# Altium footprint library ICs And Semiconductors SMD.PcbLib: 602 footprints (part 18 of 38)
Each footprint in its own frame and in the unit in brackets; x right, y up, seen from the top. Pads: shape width x height; smd on the part's side, far side on the other; paste and mask are expansions set on the pad; w line width, h text height; cw(c..) or ccw(c..) is an arc to the next point about the centre after c.
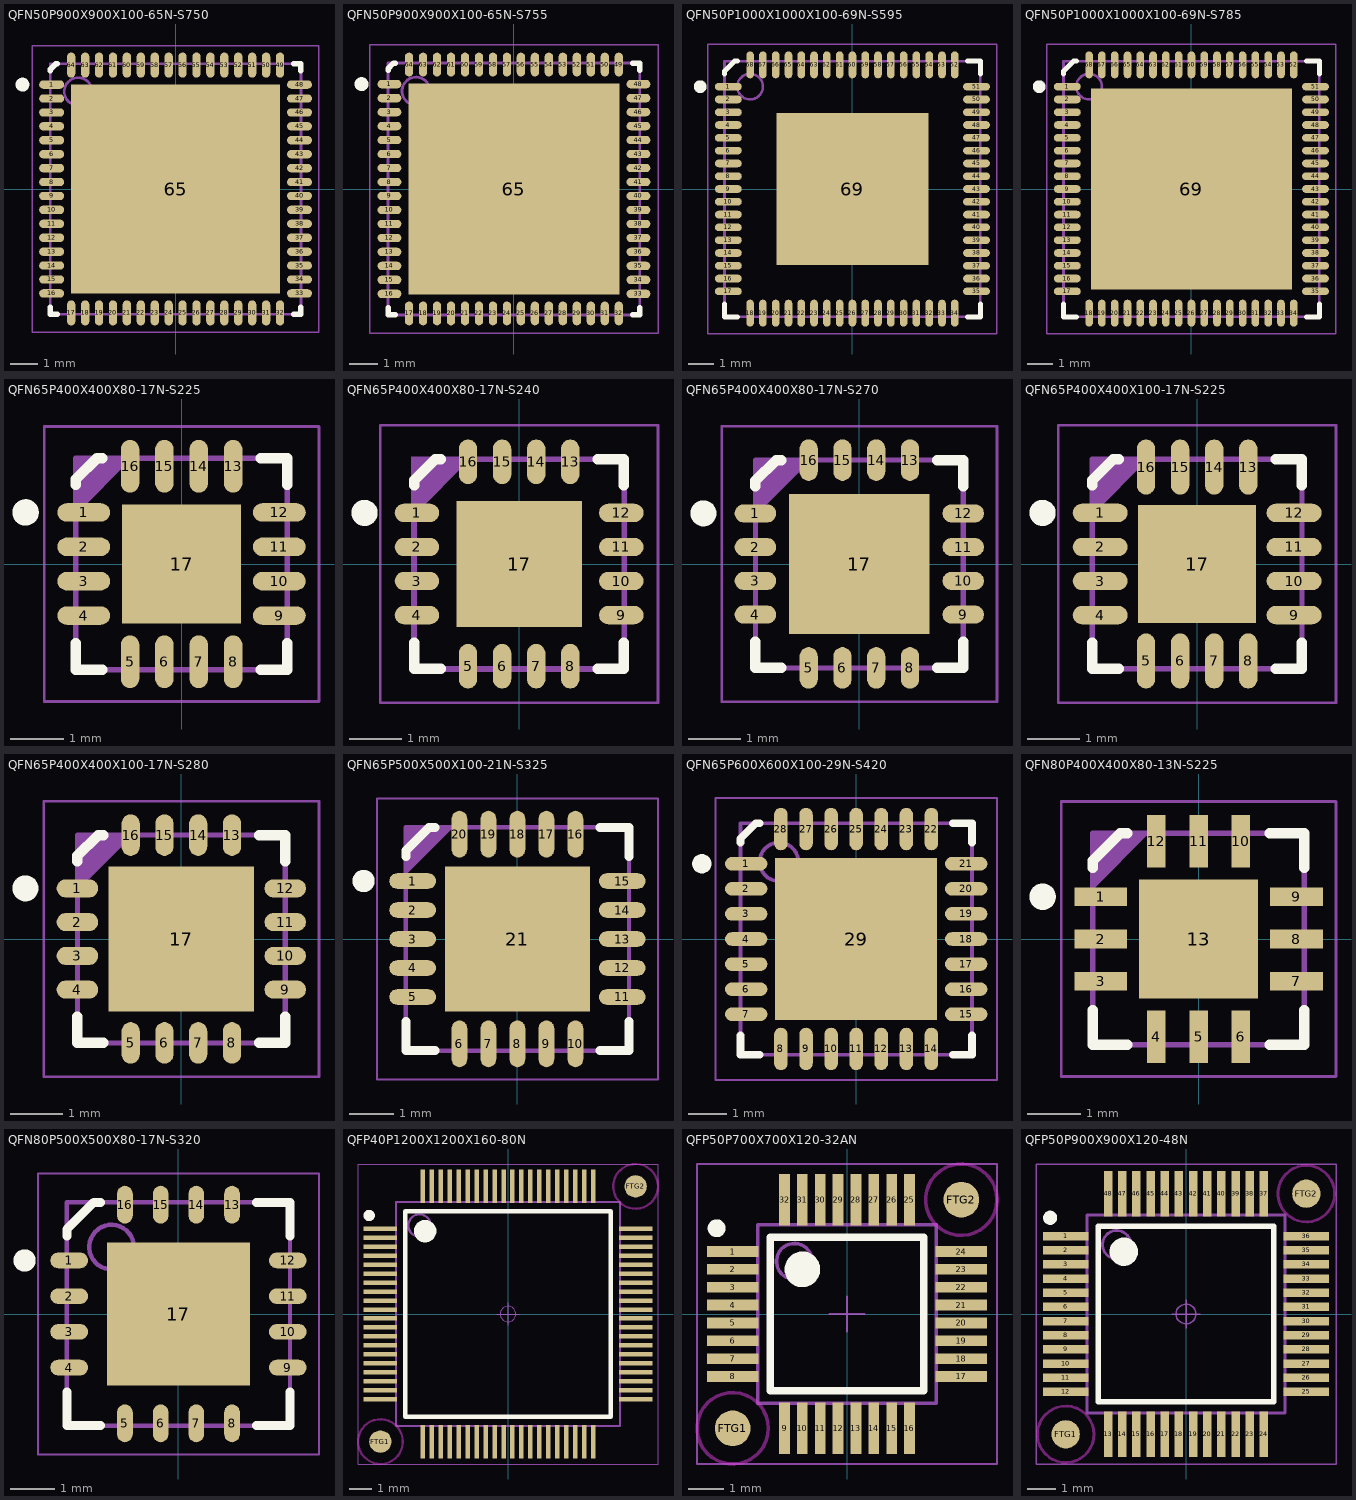
[diagram p17: the footprints below, top view; thin cyan lines are the x and y axes]

## QFN50P900X900X100-65N-S750 [mm] "QFN, 0.50mm Pitch, Square; 64 Pin, 9.00mm L X 9.00mm W X 1.00mm H Body (7.5 X 7.5mm Thermal Tab), IPC Medium Density"
height 1
pads (65):
  oval 0.9x0.3 smd: 1(-4.45,3.75) 2(-4.45,3.25) 3(-4.45,2.75) 4(-4.45,2.25) 5(-4.45,1.75) 6(-4.45,1.25) 7(-4.45,0.75) 8(-4.45,0.25) 9(-4.45,-0.25) 10(-4.45,-0.75) 11(-4.45,-1.25) 12(-4.45,-1.75) 13(-4.45,-2.25) 14(-4.45,-2.75) 15(-4.45,-3.25) 16(-4.45,-3.75) 33(4.45,-3.75) 34(4.45,-3.25) 35(4.45,-2.75) 36(4.45,-2.25) 37(4.45,-1.75) 38(4.45,-1.25) 39(4.45,-0.75) 40(4.45,-0.25) 41(4.45,0.25) 42(4.45,0.75) 43(4.45,1.25) 44(4.45,1.75) 45(4.45,2.25) 46(4.45,2.75) 47(4.45,3.25) 48(4.45,3.75)
  oval 0.3x0.9 smd: 17(-3.75,-4.45) 18(-3.25,-4.45) 19(-2.75,-4.45) 20(-2.25,-4.45) 21(-1.75,-4.45) 22(-1.25,-4.45) 23(-0.75,-4.45) 24(-0.25,-4.45) 25(0.25,-4.45) 26(0.75,-4.45) 27(1.25,-4.45) 28(1.75,-4.45) 29(2.25,-4.45) 30(2.75,-4.45) 31(3.25,-4.45) 32(3.75,-4.45) 49(3.75,4.45) 50(3.25,4.45) 51(2.75,4.45) 52(2.25,4.45) 53(1.75,4.45) 54(1.25,4.45) 55(0.75,4.45) 56(0.25,4.45) 57(-0.25,4.45) 58(-0.75,4.45) 59(-1.25,4.45) 60(-1.75,4.45) 61(-2.25,4.45) 62(-2.75,4.45) 63(-3.25,4.45) 64(-3.75,4.45)
  rect 7.5x7.5 smd: 65(0,0)
Top Overlay:
  circle w0.25: c-5.5,3.75 r0.125
  lines w0.2: -4.5,-4.25 -4.5,-4.5 -4.25,-4.5 ; -4.5,4.25 -4.5,4.3 -4.3,4.5 -4.25,4.5 ; 4.25,-4.5 4.5,-4.5 4.5,-4.25 ; 4.25,4.5 4.5,4.5 4.5,4.25
Top Paste:
  region: 1.47,1.47 1.47,3.05 3.05,3.05 3.05,1.47
  region: -0.79,1.47 -0.79,3.05 0.79,3.05 0.79,1.47
  region: -3.05,1.47 -3.05,3.05 -1.47,3.05 -1.47,1.47
  region: 1.47,-0.79 1.47,0.79 3.05,0.79 3.05,-0.79
  region: -0.79,-0.79 -0.79,0.79 0.79,0.79 0.79,-0.79
  region: -3.05,-0.79 -3.05,0.79 -1.47,0.79 -1.47,-0.79
  region: 1.47,-3.05 1.47,-1.47 3.05,-1.47 3.05,-3.05
  region: -0.79,-3.05 -0.79,-1.47 0.79,-1.47 0.79,-3.05
  region: -3.05,-3.05 -3.05,-1.47 -1.47,-1.47 -1.47,-3.05
Mechanical 14:
  circle w0.1: c-3.5,3.5 r0.5
  lines w0.1: -4.5,-4.5 4.5,-4.5 4.5,4.5 -4.5,4.5 -4.5,-4.5
Mechanical 15:
  circle w0.05: c0,0 r0.35
  lines w0.05: -0.5,0 0.5,0 ; 0,-0.5 0,0.5 ; -5.15,-5.15 5.15,-5.15 5.15,5.15 -5.15,5.15 -5.15,-5.15
3D body "QFN50P900X900X100-65N-S750.stp": height 1, standoff 0, extent -4.5,-4.5 4.5,4.5

## QFN50P900X900X100-65N-S755 [mm] "QFN, 0.50mm Pitch, Square; 64 Pin, 9.00mm L X 9.00mm W X 1.00mm H Body (7.55 X 7.55mm Thermal Tab), IPC Medium Density"
height 1
pads (65):
  oval 0.85x0.3 smd: 1(-4.45,3.75) 2(-4.45,3.25) 3(-4.45,2.75) 4(-4.45,2.25) 5(-4.45,1.75) 6(-4.45,1.25) 7(-4.45,0.75) 8(-4.45,0.25) 9(-4.45,-0.25) 10(-4.45,-0.75) 11(-4.45,-1.25) 12(-4.45,-1.75) 13(-4.45,-2.25) 14(-4.45,-2.75) 15(-4.45,-3.25) 16(-4.45,-3.75) 33(4.45,-3.75) 34(4.45,-3.25) 35(4.45,-2.75) 36(4.45,-2.25) 37(4.45,-1.75) 38(4.45,-1.25) 39(4.45,-0.75) 40(4.45,-0.25) 41(4.45,0.25) 42(4.45,0.75) 43(4.45,1.25) 44(4.45,1.75) 45(4.45,2.25) 46(4.45,2.75) 47(4.45,3.25) 48(4.45,3.75)
  oval 0.3x0.85 smd: 17(-3.75,-4.45) 18(-3.25,-4.45) 19(-2.75,-4.45) 20(-2.25,-4.45) 21(-1.75,-4.45) 22(-1.25,-4.45) 23(-0.75,-4.45) 24(-0.25,-4.45) 25(0.25,-4.45) 26(0.75,-4.45) 27(1.25,-4.45) 28(1.75,-4.45) 29(2.25,-4.45) 30(2.75,-4.45) 31(3.25,-4.45) 32(3.75,-4.45) 49(3.75,4.45) 50(3.25,4.45) 51(2.75,4.45) 52(2.25,4.45) 53(1.75,4.45) 54(1.25,4.45) 55(0.75,4.45) 56(0.25,4.45) 57(-0.25,4.45) 58(-0.75,4.45) 59(-1.25,4.45) 60(-1.75,4.45) 61(-2.25,4.45) 62(-2.75,4.45) 63(-3.25,4.45) 64(-3.75,4.45)
  rect 7.55x7.55 smd: 65(0,0)
Top Overlay:
  circle w0.25: c-5.45,3.75 r0.125
  lines w0.2: -4.5,-4.25 -4.5,-4.5 -4.25,-4.5 ; -4.5,4.25 -4.5,4.3 -4.3,4.5 -4.25,4.5 ; 4.25,-4.5 4.5,-4.5 4.5,-4.25 ; 4.25,4.5 4.5,4.5 4.5,4.25
Top Paste:
  region: 1.5,1.5 1.5,3.1 3.1,3.1 3.1,1.5
  region: -0.8,1.5 -0.8,3.1 0.8,3.1 0.8,1.5
  region: -3.1,1.5 -3.1,3.1 -1.5,3.1 -1.5,1.5
  region: 1.5,-0.8 1.5,0.8 3.1,0.8 3.1,-0.8
  region: -0.8,-0.8 -0.8,0.8 0.8,0.8 0.8,-0.8
  region: -3.1,-0.8 -3.1,0.8 -1.5,0.8 -1.5,-0.8
  region: 1.5,-3.1 1.5,-1.5 3.1,-1.5 3.1,-3.1
  region: -0.8,-3.1 -0.8,-1.5 0.8,-1.5 0.8,-3.1
  region: -3.1,-3.1 -3.1,-1.5 -1.5,-1.5 -1.5,-3.1
Mechanical 14:
  circle w0.1: c-3.5,3.5 r0.5
  lines w0.1: -4.5,-4.5 4.5,-4.5 4.5,4.5 -4.5,4.5 -4.5,-4.5
Mechanical 15:
  circle w0.05: c0,0 r0.35
  lines w0.05: -0.5,0 0.5,0 ; 0,-0.5 0,0.5 ; -5.15,-5.15 5.15,-5.15 5.15,5.15 -5.15,5.15 -5.15,-5.15
3D body "QFN50P900X900X100-65N-S755.stp": height 1, standoff 0, extent -4.5,-4.5 4.5,4.5

## QFN50P1000X1000X100-69N-S595 [mm] "QFP, 0.50mm Pitch, Square; 17 pin X 17 Pin, 10.00mm X 10.00mm (W/Thermal Tab 5.95mm X 5.95mm), IPC Medium Density"
height 1
pads (69):
  oval 1.05x0.3 smd: 1(-4.85,4) 2(-4.85,3.5) 3(-4.85,3) 4(-4.85,2.5) 5(-4.85,2) 6(-4.85,1.5) 7(-4.85,1) 8(-4.85,0.5) 9(-4.85,0) 10(-4.85,-0.5) 11(-4.85,-1) 12(-4.85,-1.5) 13(-4.85,-2) 14(-4.85,-2.5) 15(-4.85,-3) 16(-4.85,-3.5) 17(-4.85,-4) 35(4.85,-4) 36(4.85,-3.5) 37(4.85,-3) 38(4.85,-2.5) 39(4.85,-2) 40(4.85,-1.5) 41(4.85,-1) 42(4.85,-0.5) 43(4.85,0) 44(4.85,0.5) 45(4.85,1) 46(4.85,1.5) 47(4.85,2) 48(4.85,2.5) 49(4.85,3) 50(4.85,3.5) 51(4.85,4)
  oval 0.3x1.05 smd: 18(-4,-4.85) 19(-3.5,-4.85) 20(-3,-4.85) 21(-2.5,-4.85) 22(-2,-4.85) 23(-1.5,-4.85) 24(-1,-4.85) 25(-0.5,-4.85) 26(0,-4.85) 27(0.5,-4.85) 28(1,-4.85) 29(1.5,-4.85) 30(2,-4.85) 31(2.5,-4.85) 32(3,-4.85) 33(3.5,-4.85) 34(4,-4.85) 52(4,4.85) 53(3.5,4.85) 54(3,4.85) 55(2.5,4.85) 56(2,4.85) 57(1.5,4.85) 58(1,4.85) 59(0.5,4.85) 60(0,4.85) 61(-0.5,4.85) 62(-1,4.85) 63(-1.5,4.85) 64(-2,4.85) 65(-2.5,4.85) 66(-3,4.85) 67(-3.5,4.85) 68(-4,4.85)
  rect 5.95x5.95 smd: 69(0,0)
Top Overlay:
  circle w0.25: c-5.95,4 r0.125
  lines w0.2: -5,-4.5 -5,-5 -4.5,-5 ; -5,4.5 -5,4.6 -4.6,5 -4.5,5 ; 4.5,-5 5,-5 5,-4.5 ; 4.5,5 5,5 5,4.5
Top Paste:
  region: -2.24,-2.24 -2.24,-0.36 -0.36,-0.36 -0.36,-2.24
  region: 0.36,-2.24 0.36,-0.36 2.24,-0.36 2.24,-2.24
  region: -2.24,0.36 -2.24,2.24 -0.36,2.24 -0.36,0.36
  region: 0.36,0.36 0.36,2.24 2.24,2.24 2.24,0.36
Mechanical 14:
  circle w0.1: c-4,4 r0.5
  lines w0.1: -5,-5 5,-5 5,5 -5,5 -5,-5
Mechanical 15:
  lines w0.05: -5.65,-5.65 5.65,-5.65 5.65,5.65 -5.65,5.65 -5.65,-5.65
Mechanical 20:
  circle w0.05: c0,0 r0.35
  lines w0.05: -0.5,0 0.5,0 ; 0,-0.5 0,0.5
3D body "QFN50P1000X1000X100-69N-S595.stp": height 1, standoff 0, extent -5.05,-5.05 5.05,5.05

## QFN50P1000X1000X100-69N-S785 [mm] "QFP, 0.50mm pitch, square; 17 pin X 17 pin, 10.00mm X 10.00mm, IPC Medium Density"
height 1
pads (69):
  oval 1.05x0.3 smd: 1(-4.85,4) 2(-4.85,3.5) 3(-4.85,3) 4(-4.85,2.5) 5(-4.85,2) 6(-4.85,1.5) 7(-4.85,1) 8(-4.85,0.5) 9(-4.85,0) 10(-4.85,-0.5) 11(-4.85,-1) 12(-4.85,-1.5) 13(-4.85,-2) 14(-4.85,-2.5) 15(-4.85,-3) 16(-4.85,-3.5) 17(-4.85,-4) 35(4.85,-4) 36(4.85,-3.5) 37(4.85,-3) 38(4.85,-2.5) 39(4.85,-2) 40(4.85,-1.5) 41(4.85,-1) 42(4.85,-0.5) 43(4.85,0) 44(4.85,0.5) 45(4.85,1) 46(4.85,1.5) 47(4.85,2) 48(4.85,2.5) 49(4.85,3) 50(4.85,3.5) 51(4.85,4)
  oval 0.3x1.05 smd: 18(-4,-4.85) 19(-3.5,-4.85) 20(-3,-4.85) 21(-2.5,-4.85) 22(-2,-4.85) 23(-1.5,-4.85) 24(-1,-4.85) 25(-0.5,-4.85) 26(0,-4.85) 27(0.5,-4.85) 28(1,-4.85) 29(1.5,-4.85) 30(2,-4.85) 31(2.5,-4.85) 32(3,-4.85) 33(3.5,-4.85) 34(4,-4.85) 52(4,4.85) 53(3.5,4.85) 54(3,4.85) 55(2.5,4.85) 56(2,4.85) 57(1.5,4.85) 58(1,4.85) 59(0.5,4.85) 60(0,4.85) 61(-0.5,4.85) 62(-1,4.85) 63(-1.5,4.85) 64(-2,4.85) 65(-2.5,4.85) 66(-3,4.85) 67(-3.5,4.85) 68(-4,4.85)
  rect 7.85x7.85 smd: 69(0,0)
Top Overlay:
  circle w0.25: c-5.95,4 r0.125
  lines w0.2: -5,-4.5 -5,-5 -4.5,-5 ; -5,4.5 -5,4.6 -4.6,5 -4.5,5 ; 4.5,-5 5,-5 5,-4.5 ; 4.5,5 5,5 5,4.5
Top Paste:
  region: 1.55,1.55 1.55,3.21 3.21,3.21 3.21,1.55
  region: -0.83,1.55 -0.83,3.21 0.83,3.21 0.83,1.55
  region: -3.21,1.55 -3.21,3.21 -1.55,3.21 -1.55,1.55
  region: 1.55,-0.83 1.55,0.83 3.21,0.83 3.21,-0.83
  region: -0.83,-0.83 -0.83,0.83 0.83,0.83 0.83,-0.83
  region: -3.21,-0.83 -3.21,0.83 -1.55,0.83 -1.55,-0.83
  region: 1.55,-3.21 1.55,-1.55 3.21,-1.55 3.21,-3.21
  region: -0.83,-3.21 -0.83,-1.55 0.83,-1.55 0.83,-3.21
  region: -3.21,-3.21 -3.21,-1.55 -1.55,-1.55 -1.55,-3.21
Mechanical 14:
  circle w0.1: c-4,4 r0.5
  lines w0.1: -5,-5 5,-5 5,5 -5,5 -5,-5
Mechanical 15:
  lines w0.05: -0.5,0 0.5,0 ; 0,-0.5 0,0.5 ; -5.65,-5.65 5.65,-5.65 5.65,5.65 -5.65,5.65 -5.65,-5.65
3D body "QFN50P1000X1000X100-69N-S785.stp": height 1, standoff 0, extent -5.05,-5.05 5.05,5.05

## QFN65P400X400X80-17N-S225 [mm] "QFN, 0.65mm Pitch, Square; 16 Pin, 4.00mm L X 4.00mm W X 0.80mm H Body (w/Thermal tab 2.25 X 2.25mm),  IPC Medium Density"
height 0.8
pads (17):
  oval 1x0.35 smd: 1(-1.85,0.975) 2(-1.85,0.325) 3(-1.85,-0.325) 4(-1.85,-0.975) 9(1.85,-0.975) 10(1.85,-0.325) 11(1.85,0.325) 12(1.85,0.975)
  oval 0.35x1 smd: 5(-0.975,-1.85) 6(-0.325,-1.85) 7(0.325,-1.85) 8(0.975,-1.85) 13(0.975,1.85) 14(0.325,1.85) 15(-0.325,1.85) 16(-0.975,1.85)
  rect 2.25x2.25 smd: 17(0,0)
Top Overlay:
  circle w0.25: c-2.95,0.975 r0.125
  lines w0.2: -2,-1.5 -2,-2 -1.5,-2 ; -2,1.5 -2,1.6 -1.6,2 -1.5,2 ; 1.5,-2 2,-2 2,-1.5 ; 1.5,2 2,2 2,1.5
Mechanical 14:
  lines w0.1: -2,1 -1,2 ; -2,1.1 -1.1,2 ; -2,1.2 -1.2,2 ; -2,1.3 -1.3,2 ; -2,1.4 -1.4,2 ; -2,1.5 -1.5,2 ; -2,1.6 -1.6,2 ; -2,1.7 -1.7,2 ; -2,1.8 -1.8,2 ; -2,1.9 -1.9,2 ; -2,-2 -2,2 2,2 2,-2 -2,-2
Mechanical 15:
  circle w0.05: c0,0 r0.35
  lines w0.05: -0.5,0 0.5,0 ; 0,-0.5 0,0.5 ; -2.6,-2.6 -2.6,2.6 2.6,2.6 2.6,-2.6 -2.6,-2.6
3D body "QFN65P400X400X80-17N-S225.stp": height 0.8, standoff 0, extent -2,-2 2,2

## QFN65P400X400X80-17N-S240 [mm] "QFN, 0.65mm Pitch, Square; 16 Pin, 4.00mm L X 4.00mm W X 0.80mm H Body (w/Thermal tab 2.4 X 2.4mm),  IPC Medium Density"
height 0.8
pads (17):
  rrect100% 0.85x0.35 smd: 1(-1.95,0.975) 2(-1.95,0.325) 3(-1.95,-0.325) 4(-1.95,-0.975) 9(1.95,-0.975) 10(1.95,-0.325) 11(1.95,0.325) 12(1.95,0.975)
  rrect100% 0.35x0.85 smd: 5(-0.975,-1.95) 6(-0.325,-1.95) 7(0.325,-1.95) 8(0.975,-1.95) 13(0.975,1.95) 14(0.325,1.95) 15(-0.325,1.95) 16(-0.975,1.95)
  rect 2.4x2.4 smd: 17(0,0)
Top Overlay:
  circle w0.25: c-2.95,0.975 r0.125
  lines w0.2: -2,-1.5 -2,-2 -1.5,-2 ; -2,1.5 -2,1.6 -1.6,2 -1.5,2 ; 1.5,-2 2,-2 2,-1.5 ; 1.5,2 2,2 2,1.5
Mechanical 14:
  lines w0.1: -2,1 -1,2 ; -2,1.1 -1.1,2 ; -2,1.2 -1.2,2 ; -2,1.3 -1.3,2 ; -2,1.4 -1.4,2 ; -2,1.5 -1.5,2 ; -2,1.6 -1.6,2 ; -2,1.7 -1.7,2 ; -2,1.8 -1.8,2 ; -2,1.9 -1.9,2 ; -2,-2 2,-2 2,2 -2,2 -2,-2
Mechanical 15:
  circle w0.05: c0,0 r0.35
  lines w0.05: -0.5,0 0.5,0 ; 0,-0.5 0,0.5 ; -2.65,-2.65 2.65,-2.65 2.65,2.65 -2.65,2.65 -2.65,-2.65
Mechanical 21:
  lines w0.001: -2.05,-2.05 2.05,-2.05 2.05,2.05 -2.05,2.05 -2.05,-2.05
3D body "QFN65P400X400X80-17N-S240.stp": height 0.8, standoff 0, extent -2,-2 2,2

## QFN65P400X400X80-17N-S270 [mm] "QFN, 0.65mm Pitch, Square; 16 Pin, 4.00mm L X 4.00mm W X 0.80mm H Body (w/thermal tab 2.7 X 2.7mm),  IPC Medium Density"
height 0.8
pads (17):
  oval 0.8x0.35 smd: 1(-2,0.975) 2(-2,0.325) 3(-2,-0.325) 4(-2,-0.975) 9(2,-0.975) 10(2,-0.325) 11(2,0.325) 12(2,0.975)
  oval 0.35x0.8 smd: 5(-0.975,-2) 6(-0.325,-2) 7(0.325,-2) 8(0.975,-2) 13(0.975,2) 14(0.325,2) 15(-0.325,2) 16(-0.975,2)
  rect 2.7x2.7 smd: 17(0,0)
Top Overlay:
  circle w0.25: c-3,0.975 r0.125
  lines w0.2: -2,-1.5 -2,-2 -1.5,-2 ; -2,1.5 -2,1.6 -1.6,2 -1.5,2 ; 1.5,-2 2,-2 2,-1.5 ; 1.5,2 2,2 2,1.5
Mechanical 14:
  lines w0.1: -2,1 -1,2 ; -2,1.1 -1.1,2 ; -2,1.2 -1.2,2 ; -2,1.3 -1.3,2 ; -2,1.4 -1.4,2 ; -2,1.5 -1.5,2 ; -2,1.6 -1.6,2 ; -2,1.7 -1.7,2 ; -2,1.8 -1.8,2 ; -2,1.9 -1.9,2 ; -2,-2 2,-2 2,2 -2,2 -2,-2
Mechanical 15:
  circle w0.05: c0,0 r0.35
  lines w0.05: -0.5,0 0.5,0 ; 0,-0.5 0,0.5 ; -2.65,-2.65 2.65,-2.65 2.65,2.65 -2.65,2.65 -2.65,-2.65
3D body "QFN65P400X400X80-17N-S270.stp": height 0.8, standoff 0, extent -2,-2 2,2

## QFN65P400X400X100-17N-S225 [mm] "QFN, 0.65mm pitch,square; 4 pin X 4 pin, 4mm X 4mm X 1mm H body (w/thermal tab 2.25 X 2.25mm),  IPC Medium Density"
height 1
pads (17):
  oval 1.05x0.35 smd: 1(-1.85,0.975) 2(-1.85,0.325) 3(-1.85,-0.325) 4(-1.85,-0.975) 9(1.85,-0.975) 10(1.85,-0.325) 11(1.85,0.325) 12(1.85,0.975)
  oval 0.35x1.05 smd: 5(-0.975,-1.85) 6(-0.325,-1.85) 7(0.325,-1.85) 8(0.975,-1.85) 13(0.975,1.85) 14(0.325,1.85) 15(-0.325,1.85) 16(-0.975,1.85)
  rect 2.25x2.25 smd: 17(0,0)
Top Overlay:
  circle w0.25: c-2.95,0.975 r0.125
  lines w0.2: -2,-1.5 -2,-2 -1.5,-2 ; -2,1.5 -2,1.6 -1.6,2 -1.5,2 ; 1.5,-2 2,-2 2,-1.5 ; 1.5,2 2,2 2,1.5
Mechanical 14:
  lines w0.1: -2,1 -1,2 ; -2,1.1 -1.1,2 ; -2,1.2 -1.2,2 ; -2,1.3 -1.3,2 ; -2,1.4 -1.4,2 ; -2,1.5 -1.5,2 ; -2,1.6 -1.6,2 ; -2,1.7 -1.7,2 ; -2,1.8 -1.8,2 ; -2,1.9 -1.9,2 ; -2,-2 -2,2 2,2 2,-2 -2,-2
Mechanical 15:
  lines w0.05: -0.5,0 0.5,0 ; 0,-0.5 0,0.5 ; -2.65,-2.65 -2.65,2.65 2.65,2.65 2.65,-2.65 -2.65,-2.65
3D body "QFN65P400X400X100-17N-S225.stp": height 1, standoff 0, extent -2,-2 2,2

## QFN65P400X400X100-17N-S280 [mm] "QFN, 0.65mm pitch,square; 4 pin X 4 pin, 4mm X 4mm X 1mm H body (w/thermal tab 2.8 X 2.8mm),  IPC Medium Density"
height 1
pads (17):
  oval 0.8x0.35 smd: 1(-2,0.975) 2(-2,0.325) 3(-2,-0.325) 4(-2,-0.975) 9(2,-0.975) 10(2,-0.325) 11(2,0.325) 12(2,0.975)
  oval 0.35x0.8 smd: 5(-0.975,-2) 6(-0.325,-2) 7(0.325,-2) 8(0.975,-2) 13(0.975,2) 14(0.325,2) 15(-0.325,2) 16(-0.975,2)
  rect 2.8x2.8 smd: 17(0,0)
Top Overlay:
  circle w0.25: c-3,0.975 r0.125
  lines w0.2: -2,-1.5 -2,-2 -1.5,-2 ; -2,1.5 -2,1.6 -1.6,2 -1.5,2 ; 1.5,-2 2,-2 2,-1.5 ; 1.5,2 2,2 2,1.5
Mechanical 14:
  lines w0.1: -2,1 -1,2 ; -2,1.1 -1.1,2 ; -2,1.2 -1.2,2 ; -2,1.3 -1.3,2 ; -2,1.4 -1.4,2 ; -2,1.5 -1.5,2 ; -2,1.6 -1.6,2 ; -2,1.7 -1.7,2 ; -2,1.8 -1.8,2 ; -2,1.9 -1.9,2 ; -2,-2 2,-2 2,2 -2,2 -2,-2
Mechanical 15:
  lines w0.05: -0.5,0 0.5,0 ; 0,-0.5 0,0.5 ; -2.65,-2.65 2.65,-2.65 2.65,2.65 -2.65,2.65 -2.65,-2.65
3D body "QFN65P400X400X100-17N-S280.stp": height 1, standoff 0, extent -2.075,-2.075 2.075,2.075

## QFN65P500X500X100-21N-S325 [mm] "QFN, 0.65mm pitch,square; 20 pin, 5mm X 5mm X 1mm H body (w/thermal tab 3.25 X 3.25mm),  IPC Medium Density"
height 1
pads (21):
  oval 1.05x0.35 smd: 1(-2.35,1.3) 2(-2.35,0.65) 3(-2.35,0) 4(-2.35,-0.65) 5(-2.35,-1.3) 11(2.35,-1.3) 12(2.35,-0.65) 13(2.35,0) 14(2.35,0.65) 15(2.35,1.3)
  oval 0.35x1.05 smd: 6(-1.3,-2.35) 7(-0.65,-2.35) 8(0,-2.35) 9(0.65,-2.35) 10(1.3,-2.35) 16(1.3,2.35) 17(0.65,2.35) 18(0,2.35) 19(-0.65,2.35) 20(-1.3,2.35)
  rect 3.25x3.25 smd: 21(0,0)
Top Overlay:
  circle w0.25: c-3.45,1.3 r0.125
  lines w0.2: -2.5,-1.85 -2.5,-2.5 -1.85,-2.5 ; -2.5,1.85 -2.5,1.98 -1.98,2.5 -1.85,2.5 ; 1.85,-2.5 2.5,-2.5 2.5,-1.85 ; 1.85,2.5 2.5,2.5 2.5,1.85
Mechanical 14:
  lines w0.1: -2.5,1.5 -1.5,2.5 ; -2.5,1.6 -1.6,2.5 ; -2.5,1.7 -1.7,2.5 ; -2.5,1.8 -1.8,2.5 ; -2.5,1.9 -1.9,2.5 ; -2.5,2 -2,2.5 ; -2.5,2.1 -2.1,2.5 ; -2.5,2.2 -2.2,2.5 ; -2.5,2.3 -2.3,2.5 ; -2.5,2.4 -2.4,2.5 ; -2.5,-2.5 -2.5,2.5 2.5,2.5 2.5,-2.5 -2.5,-2.5
Mechanical 15:
  lines w0.05: -0.5,0 0.5,0 ; 0,-0.5 0,0.5 ; -3.15,-3.15 -3.15,3.15 3.15,3.15 3.15,-3.15 -3.15,-3.15
3D body "QFN65P500X500X100-21N-S325.stp": height 1, standoff 0, extent -2.575,-2.575 2.575,2.575

## QFN65P600X600X100-29N-S420 [mm] "QFN, 0.65mm pitch, square; 28 pin, 6.00mm L X 6.00mm W X 1.00mm H body (w/thermal tab 4.2mm x 4.2mm), IPC Medium Density"
height 1
pads (29):
  oval 1.1x0.35 smd: 1(-2.85,1.95) 2(-2.85,1.3) 3(-2.85,0.65) 4(-2.85,0) 5(-2.85,-0.65) 6(-2.85,-1.3) 7(-2.85,-1.95) 15(2.85,-1.95) 16(2.85,-1.3) 17(2.85,-0.65) 18(2.85,0) 19(2.85,0.65) 20(2.85,1.3) 21(2.85,1.95)
  oval 0.35x1.1 smd: 8(-1.95,-2.85) 9(-1.3,-2.85) 10(-0.65,-2.85) 11(0,-2.85) 12(0.65,-2.85) 13(1.3,-2.85) 14(1.95,-2.85) 22(1.95,2.85) 23(1.3,2.85) 24(0.65,2.85) 25(0,2.85) 26(-0.65,2.85) 27(-1.3,2.85) 28(-1.95,2.85)
  rect 4.2x4.2 smd: 29(0,0)
Top Overlay:
  circle w0.25: c-4,1.95 r0.125
  lines w0.2: -3,-2.5 -3,-3 -2.5,-3 ; -3,2.5 -3,2.6 -2.6,3 -2.5,3 ; 2.5,-3 3,-3 3,-2.5 ; 2.5,3 3,3 3,2.5
Mechanical 14:
  circle w0.1: c-2,2 r0.5
  lines w0.1: -3,-3 3,-3 3,3 -3,3 -3,-3
Mechanical 15:
  circle w0.05: c0,0 r0.35
  lines w0.05: -0.5,0 0.5,0 ; 0,-0.5 0,0.5 ; -3.65,-3.65 3.65,-3.65 3.65,3.65 -3.65,3.65 -3.65,-3.65
3D body "QFN65P600X600X100-29N-S420.stp": height 0.98, standoff -0.02, extent -3,-3 3,3

## QFN80P400X400X80-13N-S225 [mm] "QFN,0.80mm Pitch,Square;12 Pin,4.00mm L X 4.00mm W X 0.80mm H body (w/thermal tab 2.25 X 2.25mm),  IPC Medium Density"
height 0.8
pads (13):
  rect 1x0.35 smd: 1(-1.85,0.8) 2(-1.85,0) 3(-1.85,-0.8) 7(1.85,-0.8) 8(1.85,0) 9(1.85,0.8)
  rect 0.35x1 smd: 4(-0.8,-1.85) 5(0,-1.85) 6(0.8,-1.85) 10(0.8,1.85) 11(0,1.85) 12(-0.8,1.85)
  rect 2.25x2.25 smd: 13(0,0)
Top Overlay:
  circle w0.25: c-2.95,0.8 r0.125
  lines w0.2: -2,-1.35 -2,-2 -1.35,-2 ; -2,1.35 -2,1.48 -1.48,2 -1.35,2 ; 1.35,-2 2,-2 2,-1.35 ; 1.35,2 2,2 2,1.35
Mechanical 14:
  lines w0.1: -2,1 -1,2 ; -2,1.1 -1.1,2 ; -2,1.2 -1.2,2 ; -2,1.3 -1.3,2 ; -2,1.4 -1.4,2 ; -2,1.5 -1.5,2 ; -2,1.6 -1.6,2 ; -2,1.7 -1.7,2 ; -2,1.8 -1.8,2 ; -2,1.9 -1.9,2 ; -2,-2 -2,2 2,2 2,-2 -2,-2
Mechanical 15:
  circle w0.05: c0,0 r0.35
  lines w0.05: -0.5,0 0.5,0 ; 0,-0.5 0,0.5 ; -2.6,-2.6 -2.6,2.6 2.6,2.6 2.6,-2.6 -2.6,-2.6

## QFN80P500X500X80-17N-S320 [mm] "QFN, 0.80mm Pitch, Square; 16 Pin, 5.00mm L X 5.00mm W X 0.80mm H body (w/thermal tab 3.2 X 3.2mm),  IPC Medium Density"
height 0.8
pads (17):
  oval 0.85x0.35 smd: 1(-2.45,1.2) 2(-2.45,0.4) 3(-2.45,-0.4) 4(-2.45,-1.2) 9(2.45,-1.2) 10(2.45,-0.4) 11(2.45,0.4) 12(2.45,1.2)
  oval 0.35x0.85 smd: 5(-1.2,-2.45) 6(-0.4,-2.45) 7(0.4,-2.45) 8(1.2,-2.45) 13(1.2,2.45) 14(0.4,2.45) 15(-0.4,2.45) 16(-1.2,2.45)
  rect 3.2x3.2 smd: 17(0,0)
Top Overlay:
  circle w0.25: c-3.45,1.2 r0.125
  lines w0.2: -2.5,-1.75 -2.5,-2.5 -1.75,-2.5 ; -2.5,1.75 -2.5,1.9 -1.9,2.5 -1.75,2.5 ; 1.75,-2.5 2.5,-2.5 2.5,-1.75 ; 1.75,2.5 2.5,2.5 2.5,1.75
Top Paste:
  region: -1.012,1.012 1.012,1.012 1.012,-1.012 -1.012,-1.012
Mechanical 14:
  circle w0.1: c-1.5,1.5 r0.5
  lines w0.1: -2.5,-2.5 2.5,-2.5 2.5,2.5 -2.5,2.5 -2.5,-2.5
Mechanical 15:
  circle w0.05: c0,0 r0.35
  lines w0.05: -0.5,0 0.5,0 ; 0,-0.5 0,0.5 ; -3.15,-3.15 3.15,-3.15 3.15,3.15 -3.15,3.15 -3.15,-3.15
3D body "QFN80P500X500X80-17N-S320.stp": height 0.9, standoff 0, extent -2.55,-2.55 2.55,2.55

## QFP40P1200X1200X160-80N [mm] "QFP, 0.40mm Pitch, Square; 80 Pin, 10.00mm L X 10.00mm W X 1.60mm H body, IPC Medium Density"
height 1.6
pads (82):
  rect 1.5x0.2 smd: 1(-5.7,3.8) 2(-5.7,3.4) 3(-5.7,3) 4(-5.7,2.6) 5(-5.7,2.2) 6(-5.7,1.8) 7(-5.7,1.4) 8(-5.7,1) 9(-5.7,0.6) 10(-5.7,0.2) 11(-5.7,-0.2) 12(-5.7,-0.6) 13(-5.7,-1) 14(-5.7,-1.4) 15(-5.7,-1.8) 16(-5.7,-2.2) 17(-5.7,-2.6) 18(-5.7,-3) 19(-5.7,-3.4) 20(-5.7,-3.8) 41(5.7,-3.8) 42(5.7,-3.4) 43(5.7,-3) 44(5.7,-2.6) 45(5.7,-2.2) 46(5.7,-1.8) 47(5.7,-1.4) 48(5.7,-1) 49(5.7,-0.6) 50(5.7,-0.2) 51(5.7,0.2) 52(5.7,0.6) 53(5.7,1) 54(5.7,1.4) 55(5.7,1.8) 56(5.7,2.2) 57(5.7,2.6) 58(5.7,3) 59(5.7,3.4) 60(5.7,3.8)
  rect 0.2x1.5 smd: 21(-3.8,-5.7) 22(-3.4,-5.7) 23(-3,-5.7) 24(-2.6,-5.7) 25(-2.2,-5.7) 26(-1.8,-5.7) 27(-1.4,-5.7) 28(-1,-5.7) 29(-0.6,-5.7) 30(-0.2,-5.7) 31(0.2,-5.7) 32(0.6,-5.7) 33(1,-5.7) 34(1.4,-5.7) 35(1.8,-5.7) 36(2.2,-5.7) 37(2.6,-5.7) 38(3,-5.7) 39(3.4,-5.7) 40(3.8,-5.7) 61(3.8,5.7) 62(3.4,5.7) 63(3,5.7) 64(2.6,5.7) 65(2.2,5.7) 66(1.8,5.7) 67(1.4,5.7) 68(1,5.7) 69(0.6,5.7) 70(0.2,5.7) 71(-0.2,5.7) 72(-0.6,5.7) 73(-1,5.7) 74(-1.4,5.7) 75(-1.8,5.7) 76(-2.2,5.7) 77(-2.6,5.7) 78(-3,5.7) 79(-3.4,5.7) 80(-3.8,5.7)
  round 1 smd paste-0.51 mask+0.5: FTG1(-5.7,-5.7) FTG2(5.7,5.7)
Top Layer keep-out:
  circle w0.1: c5.7,5.7 r1
  circle w0.1: c-5.7,-5.7 r1
Top Overlay:
  circle w0.25: c-6.2,4.4 r0.125
  circle w0.5: c-3.7,3.7 r0.25
  lines w0.2: -4.6,-4.6 4.6,-4.6 4.6,4.6 -4.6,4.6 -4.6,-4.6
Mechanical 14:
  circle w0.1: c-3.95,3.95 r0.5
  lines w0.1: -5,-5 5,-5 5,5 -5,5 -5,-5
Mechanical 15:
  circle w0.05: c0,0 r0.35
  lines w0.05: -0.5,0 0.5,0 ; 0,-0.5 0,0.5 ; -6.7,-6.7 6.7,-6.7 6.7,6.7 -6.7,6.7 -6.7,-6.7
3D body "QFP40P1200X1200X160-80N.stp": height 1.63, standoff 0, extent -6.016,-6.016 6.016,6.016

## QFP50P700X700X120-32AN [mm] "QFP,0.50mm Pitch, Square; 32 Pin, 5.00mm L X 5.00mm W X 1.20mm H Body, IPC Medium Density"
height 1.2
pads (34):
  rect 1.45x0.3 smd: 1(-3.2,1.75) 2(-3.2,1.25) 3(-3.2,0.75) 4(-3.2,0.25) 5(-3.2,-0.25) 6(-3.2,-0.75) 7(-3.2,-1.25) 8(-3.2,-1.75) 17(3.2,-1.75) 18(3.2,-1.25) 19(3.2,-0.75) 20(3.2,-0.25) 21(3.2,0.25) 22(3.2,0.75) 23(3.2,1.25) 24(3.2,1.75)
  rect 0.3x1.45 smd: 9(-1.75,-3.2) 10(-1.25,-3.2) 11(-0.75,-3.2) 12(-0.25,-3.2) 13(0.25,-3.2) 14(0.75,-3.2) 15(1.25,-3.2) 16(1.75,-3.2) 25(1.75,3.2) 26(1.25,3.2) 27(0.75,3.2) 28(0.25,3.2) 29(-0.25,3.2) 30(-0.75,3.2) 31(-1.25,3.2) 32(-1.75,3.2)
  round 1 smd paste-0.51 mask+0.5: FTG1(-3.2,-3.2) FTG2(3.2,3.2)
Top Layer keep-out:
  circle w0.1: c3.2,3.2 r1
  circle w0.1: c-3.2,-3.2 r1
Top Overlay:
  circle w0.25: c-3.65,2.4 r0.125
  circle w0.5: c-1.25,1.25 r0.25
  lines w0.2: -2.15,-2.15 2.15,-2.15 2.15,2.15 -2.15,2.15 -2.15,-2.15
Mechanical 14:
  circle w0.1: c-1.475,1.475 r0.5
  lines w0.1: -2.5,-2.5 -2.5,2.5 2.5,2.5 2.5,-2.5 -2.5,-2.5
Mechanical 15:
  lines w0.05: -0.5,0 0.5,0 ; 0,-0.5 0,0.5 ; -4.2,-4.2 -4.2,4.2 4.2,4.2 4.2,-4.2 -4.2,-4.2
3D body "QFP50P700X700X120-32AN.stp": height 1.2, standoff 0, extent -3.55,-3.55 3.55,3.55

## QFP50P900X900X120-48N [mm] "QFP, 0.50mm Pitch, Square, 12 pin X 12 Pin, 7.00mm X 7.00mm X 1.20mm Body, IPC Medium Density"
height 1.2
pads (50):
  rect 1.6x0.3 smd: 1(-4.25,2.75) 2(-4.25,2.25) 3(-4.25,1.75) 4(-4.25,1.25) 5(-4.25,0.75) 6(-4.25,0.25) 7(-4.25,-0.25) 8(-4.25,-0.75) 9(-4.25,-1.25) 10(-4.25,-1.75) 11(-4.25,-2.25) 12(-4.25,-2.75) 25(4.25,-2.75) 26(4.25,-2.25) 27(4.25,-1.75) 28(4.25,-1.25) 29(4.25,-0.75) 30(4.25,-0.25) 31(4.25,0.25) 32(4.25,0.75) 33(4.25,1.25) 34(4.25,1.75) 35(4.25,2.25) 36(4.25,2.75)
  rect 0.3x1.6 smd: 13(-2.75,-4.25) 14(-2.25,-4.25) 15(-1.75,-4.25) 16(-1.25,-4.25) 17(-0.75,-4.25) 18(-0.25,-4.25) 19(0.25,-4.25) 20(0.75,-4.25) 21(1.25,-4.25) 22(1.75,-4.25) 23(2.25,-4.25) 24(2.75,-4.25) 37(2.75,4.25) 38(2.25,4.25) 39(1.75,4.25) 40(1.25,4.25) 41(0.75,4.25) 42(0.25,4.25) 43(-0.25,4.25) 44(-0.75,4.25) 45(-1.25,4.25) 46(-1.75,4.25) 47(-2.25,4.25) 48(-2.75,4.25)
  round 1 smd paste-0.51 mask+0.5: FTG1(-4.25,-4.25) FTG2(4.25,4.25)
Top Layer keep-out:
  circle w0.1: c-4.25,-4.25 r1
  circle w0.1: c4.25,4.25 r1
Top Overlay:
  circle w0.5: c-2.2,2.2 r0.25
  circle w0.25: c-4.8,3.4 r0.125
  lines w0.2: -3.1,-3.1 -3.1,3.1 3.1,3.1 3.1,-3.1 -3.1,-3.1
Mechanical 14:
  circle w0.1: c-2.45,2.45 r0.5
  lines w0.1: -3.5,-3.5 -3.5,3.5 3.5,3.5 3.5,-3.5 -3.5,-3.5
Mechanical 15:
  circle w0.05: c0,0 r0.35
  lines w0.05: -0.5,0 0.5,0 ; 0,-0.5 0,0.5 ; -5.3,-5.3 -5.3,5.3 5.3,5.3 5.3,-5.3 -5.3,-5.3
3D body "QFP50P900X900X120-48N.stp": height 1.2, standoff 0, extent -4.6,-4.6 4.6,4.6